# Altium footprint library HamedLib.PcbLib: 221 footprints (part 9 of 14)
Each footprint in its own frame and in the unit in brackets; x right, y up, seen from the top. Pads: shape width x height; smd on the part's side, far side on the other; paste and mask are expansions set on the pad; w line width, h text height; cw(c..) or ccw(c..) is an arc to the next point about the centre after c.
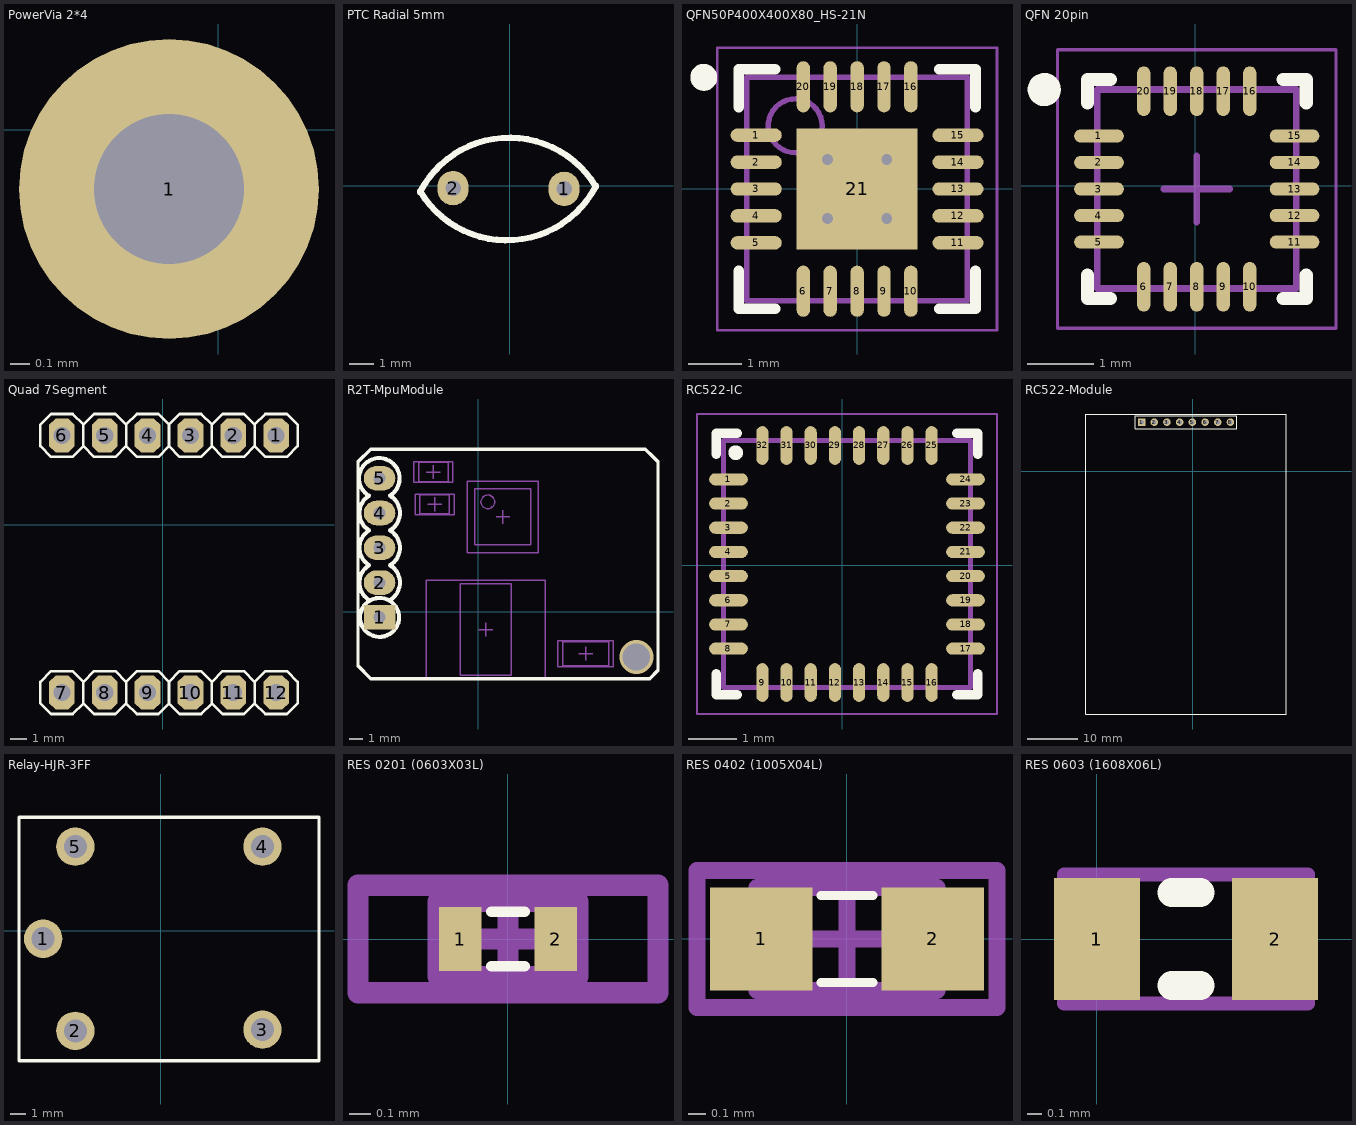
[diagram p8: the footprints below, top view; thin cyan lines are the x and y axes]

## PowerVia2*6 [mm]
via 8.85,-0.725 diameter 1.27 hole 0.711
via 8.85,1.175 diameter 1.27 hole 0.711
via 6.95,1.175 diameter 1.27 hole 0.711
via 6.95,-0.725 diameter 1.27 hole 0.711
via 5.05,-0.725 diameter 1.27 hole 0.711
via 5.05,1.175 diameter 1.27 hole 0.711
via 3.15,1.175 diameter 1.27 hole 0.711
via 3.15,-0.725 diameter 1.27 hole 0.711
via 1.25,-0.725 diameter 1.27 hole 0.711
via 1.25,1.175 diameter 1.27 hole 0.711
via -0.65,1.175 diameter 1.27 hole 0.711
via -0.65,-0.725 diameter 1.27 hole 0.711

## PowerVia 2*2 [mm]
via -1.85,-1.9 diameter 1.27 hole 0.711
via -1.85,0 diameter 1.27 hole 0.711
via 0.05,0 diameter 1.27 hole 0.711
via 0.05,-1.9 diameter 1.27 hole 0.711

## PowerVia 2*3 [mm]
via -2.275,-1.9 diameter 1.27 hole 0.711
via -2.275,0 diameter 1.27 hole 0.711
via -0.375,0 diameter 1.27 hole 0.711
via -0.375,-1.9 diameter 1.27 hole 0.711
via 1.525,-1.9 diameter 1.27 hole 0.711
via 1.525,0 diameter 1.27 hole 0.711

## PowerVia 2*4 [mil]
pads (1):
  round 60 hole 30: 1(-9.84,-11.81)
via -159.45,-11.81 diameter 50 hole 28
via -159.45,62.99 diameter 50 hole 28
via -84.65,62.99 diameter 50 hole 28
via -84.65,-11.81 diameter 50 hole 28
via -9.84,-11.81 diameter 50 hole 28
via 64.96,62.99 diameter 50 hole 28
via 64.96,-11.81 diameter 50 hole 28
via -9.84,62.99 diameter 50 hole 28

## PowerVia 9pin [mm]
via 0.025,1.975 diameter 1.27 hole 0.711
via 0.025,3.875 diameter 1.27 hole 0.711
via 1.925,3.875 diameter 1.27 hole 0.711
via 1.925,1.975 diameter 1.27 hole 0.711
via 3.825,1.975 diameter 1.27 hole 0.711
via 3.825,3.875 diameter 1.27 hole 0.711
via 0.025,0.075 diameter 1.27 hole 0.711
via 1.925,0.075 diameter 1.27 hole 0.711
via 3.825,0.075 diameter 1.27 hole 0.711

## PTC Radial 5mm [mm]
pads (2):
  oval 1.27x1.397 hole 0.635: 1(2.225,-0.125) 2(-2.3,-0.1)
Top Overlay:
  lines w0.254: -3.649,-0.264 cw(c-0.003,-2.141) 3.525,-0.05 ; -3.649,-0.214 ccw(c-0.121,1.877) 3.525,0
3D body "User Library-RXE020-PTC.STEP": height 12.79, standoff -1.9, extent -3.625,-1.65 3.775,1.35

## QFN50P400X400X80_HS-21N [mm] "QFN, 20-Leads, Body 4.00x4.00mm, Pitch 0.50mm, Thermal Pad 2.25x2.25mm, IPC Medium Density"
height 0.8
pads (21):
  oval 0.95x0.25 smd: 1(-1.875,1) 2(-1.875,0.5) 3(-1.875,0) 4(-1.875,-0.5) 5(-1.875,-1) 11(1.875,-1) 12(1.875,-0.5) 13(1.875,0) 14(1.875,0.5) 15(1.875,1)
  oval 0.25x0.95 smd: 6(-1,-1.9) 7(-0.5,-1.9) 8(0,-1.9) 9(0.5,-1.9) 10(1,-1.9) 16(1,1.9) 17(0.5,1.9) 18(0,1.9) 19(-0.5,1.9) 20(-1,1.9)
  rect 2.25x2.25 smd: 21(0,0)
via 0.55,-0.55 diameter 0.5 hole 0.2
via -0.55,-0.55 diameter 0.5 hole 0.2
via 0.55,0.55 diameter 0.5 hole 0.2
via -0.55,0.55 diameter 0.5 hole 0.2
Top Overlay:
  circle w0.25: c-2.85,2.075 r0.125
  lines w0.2: -2.2,-1.525 -2.2,-2.225 -1.525,-2.225 ; -2.2,1.525 -2.2,2.225 -1.525,2.225 ; 1.525,-2.225 2.2,-2.225 2.2,-1.525 ; 1.525,2.225 2.2,2.225 2.2,1.525
Mechanical 13:
  circle w0.1: c-1.15,1.175 r0.5
  lines w0.1: -2.05,-2.075 2.05,-2.075 2.05,2.075 -2.05,2.075 -2.05,-2.075
Mechanical 15:
  lines w0.05: -2.6,-2.625 2.6,-2.625 2.6,2.625 -2.6,2.625 -2.6,-2.625
  lines w0.1: -0.5,0 0.5,0 ; 0,-0.5 0,0.5
3D body "User Library-QFN4x4_20pins.step": height 0.8, standoff 0, extent -2.02,-2.02 2.02,2.02

## QFN 20pin [mm] "MPR121"
pads (20):
  oval 0.75x0.2 smd: 1(-1.45,0.749) 2(-1.45,0.349) 3(-1.45,-0.051) 4(-1.45,-0.451) 5(-1.45,-0.851) 11(1.5,-0.851) 12(1.5,-0.451) 13(1.5,-0.051) 14(1.5,0.349) 15(1.5,0.749)
  oval 0.2x0.75 smd: 6(-0.775,-1.526) 7(-0.375,-1.526) 8(0.025,-1.526) 9(0.425,-1.526) 10(0.825,-1.526) 16(0.825,1.424) 17(0.425,1.424) 18(0.025,1.424) 19(-0.375,1.424) 20(-0.775,1.424)
Top Overlay:
  circle w0.25: c-2.275,1.449 r0.125
  lines w0.2: -1.625,-1.351 -1.625,-1.701 -1.275,-1.701 ; -1.625,1.249 -1.625,1.599 -1.275,1.599 ; 1.325,-1.701 1.675,-1.701 1.675,-1.351 ; 1.325,1.599 1.675,1.599 1.675,1.249
Mechanical 13:
  lines w0.1: -1.475,-1.551 1.525,-1.551 1.525,1.449 -1.475,1.449 -1.475,-1.551
Mechanical 15:
  lines w0.05: -2.075,-2.151 2.125,-2.151 2.125,2.049 -2.075,2.049 -2.075,-2.151
  lines w0.1: -0.475,-0.051 0.525,-0.051 ; 0.025,-0.551 0.025,0.449
3D body "User Library-QFN-20-2.STEP": height 0.75, standoff 0, extent -1.484,-1.561 1.536,1.459

## Quad 7Segment [mil]
height 748.03
pads (12):
  oct 60x80 hole 40: 1(265,208) 2(165,208) 3(65,208) 4(-35,208) 5(-135,208) 6(-235,208) 7(-235,-392) 8(-135,-392) 9(-35,-392) 10(65,-392) 11(165,-392) 12(265,-392)
Top Overlay:
  region: -125,-382 -145,-382 -145,-402 -125,-402
  region: -25,-382 -45,-382 -45,-402 -25,-402
  region: 75,-382 55,-382 55,-402 75,-402
  region: 175,-382 155,-382 155,-402 175,-402
  region: 275,-382 255,-382 255,-402 275,-402
  region: -225,-382 -245,-382 -245,-402 -225,-402
  region: -225,218 -245,218 -245,198 -225,198
  region: 275,218 255,218 255,198 275,198
  region: 175,218 155,218 155,198 175,198
  region: 75,218 55,218 55,198 75,198
  region: -25,218 -45,218 -45,198 -25,198
  region: -125,218 -145,218 -145,198 -125,198
  lines w6: -185,-417 -160,-442 -110,-442 -85,-417 ; -185,-417 -185,-367 ; -185,-417 -210,-442 -260,-442 -285,-417 -285,-367 -260,-342 -210,-342 -185,-367 ; -185,-367 -160,-342 -110,-342 -85,-367 ; -185,183 -210,158 -260,158 -285,183 -285,233 -260,258 -210,258 -185,233 ; -185,183 -185,233 ; -185,183 -160,158 -110,158 -85,183 ; -185,233 -160,258 -110,258 -85,233 ; -85,-417 -60,-442 -10,-442 15,-417 ; -85,-417 -85,-367 ; -85,-367 -60,-342 -10,-342 15,-367 ; -85,183 -85,233 ; -85,183 -60,158 -10,158 15,183 ; -85,233 -60,258 -10,258 15,233 ; 15,-417 40,-442 90,-442 115,-417 ; 15,-417 15,-367 ; 15,-367 40,-342 90,-342 115,-367 ; 15,183 15,233 ; 15,183 40,158 90,158 115,183 ; 15,233 40,258 90,258 115,233 ; 115,-417 140,-442 190,-442 215,-417 ; 115,-417 115,-367 ; 115,-367 140,-342 190,-342 215,-367 ; 115,183 115,233 ; 115,183 140,158 190,158 215,183 ; 115,233 140,258 190,258 215,233 ; 215,-417 240,-442 290,-442 315,-417 315,-367 290,-342 240,-342 215,-367 ; 215,-417 215,-367 ; 215,183 215,233 ; 215,183 240,158 290,158 315,183 315,233 290,258 240,258 215,233
3D body "quad 7segment.STEP": height 476.38, standoff 196.85, extent -978.88,-466.03 1029,282

## R2T-MpuModule [mm]
pads (5):
  rect 2.3x1.8 hole 0.9: 1(-7.2,-0.399)
  oval 2.3x1.8 hole 0.9: 2(-7.2,2.141) 3(-7.2,4.681) 4(-7.2,7.221) 5(-7.2,9.761)
via 11.55,-3.289 diameter 2.5 hole 2
Bottom Layer:
  lines w0.25: -7.2,9.761 -7.2,10.286
Top Overlay:
  circle w0.3: c-7.2,-0.399 r1.42
  lines w0.25: -7.877,-4.839 -8.775,-3.941 -8.775,10.961 -7.85,11.886 12.2,11.886 12.775,11.311 13.125,10.961 13.125,-4.264 12.525,-4.864 -7.852,-4.864
  lines w0.3: -7.985,8.477 cw(c-7.223,9.747) -6.438,8.491 cw(c-7.2,7.221) -6.438,5.951 cw(c-7.2,4.681) -6.438,3.411 cw(c-7.2,2.141) -6.438,0.871 ; -7.962,0.871 cw(c-7.2,2.141) -7.962,3.411 cw(c-7.2,4.681) -7.962,5.951 cw(c-7.2,7.221) -7.962,8.491
Mechanical 13:
  circle w0.1: c0.7,8.036 r0.5
  lines w0.1: -4.35,9.511 -4.35,10.911 -2.2,10.911 -2.2,9.511 -4.35,9.511 ; -4.25,7.156 -4.25,8.556 -2.1,8.556 -2.1,7.156 -4.25,7.156 ; -1.3,-4.639 2.4,-4.639 2.4,2.061 -1.3,2.061 -1.3,-4.639 ; -0.25,4.886 3.85,4.886 3.85,8.986 -0.25,8.986 -0.25,4.886 ; 6.173,-3.914 6.173,-2.164 9.523,-2.164 9.523,-3.914 6.173,-3.914
Mechanical 15:
  lines w0.1: -3.775,10.211 -2.775,10.211 ; -3.675,7.856 -2.675,7.856 ; -3.275,9.711 -3.275,10.711 ; -3.175,7.356 -3.175,8.356 ; 0.05,-1.289 1.05,-1.289 ; 0.55,-1.789 0.55,-0.789 ; 1.3,6.936 2.3,6.936 ; 1.8,6.436 1.8,7.436 ; 7.348,-3.039 8.348,-3.039 ; 7.848,-3.539 7.848,-2.539 ; -4.7,9.461 -4.7,10.961 -1.85,10.961 -1.85,9.461 -4.7,9.461 ; -4.6,7.106 -4.6,8.606 -1.75,8.606 -1.75,7.106 -4.6,7.106 ; -3.8,-4.889 4.9,-4.889 4.9,2.311 -3.8,2.311 -3.8,-4.889 ; -0.8,4.336 4.4,4.336 4.4,9.536 -0.8,9.536 -0.8,4.336 ; 5.823,-3.989 5.823,-2.089 9.873,-2.089 9.873,-3.989 5.823,-3.989
3D body: height 7, standoff 0, extent -7.622,-0.774 -6.825,0.024
3D body: height 7, standoff 0, extent -7.622,1.776 -6.825,2.574
3D body: height 7, standoff 0, extent -7.622,4.326 -6.825,5.124
3D body: height 7, standoff 0, extent -7.622,6.851 -6.825,7.649
3D body: height 7, standoff 0, extent -7.622,9.426 -6.825,10.224
3D body "Mpu6055_PCB.step": height 7.36, standoff 3.81, extent -9.05,-5.1 13.25,12.1

## RC522-IC [mm]
pads (32):
  oval 0.8x0.25 smd: 1(-2.354,1.775) 2(-2.354,1.275) 3(-2.354,0.775) 4(-2.354,0.275) 5(-2.354,-0.225) 6(-2.354,-0.725) 7(-2.354,-1.225) 8(-2.354,-1.725) 17(2.546,-1.725) 18(2.546,-1.225) 19(2.546,-0.725) 20(2.546,-0.225) 21(2.546,0.275) 22(2.546,0.775) 23(2.546,1.275) 24(2.546,1.775)
  oval 0.25x0.8 smd: 9(-1.654,-2.425) 10(-1.154,-2.425) 11(-0.654,-2.425) 12(-0.154,-2.425) 13(0.346,-2.425) 14(0.846,-2.425) 15(1.346,-2.425) 16(1.846,-2.425) 25(1.846,2.475) 26(1.346,2.475) 27(0.846,2.475) 28(0.346,2.475) 29(-0.154,2.475) 30(-0.654,2.475) 31(-1.154,2.475) 32(-1.654,2.475)
Top Overlay:
  circle w0.254: c-2.204,2.325 r0.025
  lines w0.2: -2.604,-2.25 -2.604,-2.675 -2.179,-2.675 ; -2.604,2.3 -2.604,2.725 -2.179,2.725 ; 2.371,-2.675 2.796,-2.675 2.796,-2.25 ; 2.371,2.725 2.796,2.725 2.796,2.3
Mechanical 13:
  lines w0.1: -2.454,-2.525 2.646,-2.525 2.646,2.575 -2.454,2.575 -2.454,-2.525
Mechanical 15:
  lines w0.05: -3.004,-3.075 3.196,-3.075 3.196,3.125 -3.004,3.125 -3.004,-3.075
3D body "User Library-QFN-32UH.step": height 0.75, standoff 0, extent -2.408,-2.484 2.612,2.536

## RC522-Module [mm]
pads (8):
  rect 1.5x1.5 hole 0.9: 1(-10.24,9.785)
  round 1.5 hole 0.9: 2(-7.7,9.785) 3(-5.16,9.785) 4(-2.62,9.785) 5(-0.08,9.785) 6(2.46,9.785) 7(5,9.785) 8(7.54,9.785)
Top Overlay:
  lines w0.2: -21.35,-48.575 -21.35,11.425 18.65,11.425 18.65,-48.575 -21.35,-48.575 ; -11.51,8.515 -11.51,11.055 8.81,11.055 8.81,8.515 -11.51,8.515
Mechanical 1:
  lines w0.2: -21.35,-48.575 -20.35,-48.575
3D body "rc522.STEP": height 8.5, standoff -6.3, extent -20.85,-49.025 19.15,10.975

## Relay-HJR-3FF [mm]
pads (5):
  round 2.5 hole 1.5: 1(-7.653,-0.537) 2(-5.553,-6.537) 3(6.647,-6.459) 4(6.647,5.463) 5(-5.553,5.463)
Top Overlay:
  lines w0.2: -9.226,-8.491 -9.226,7.384 10.332,7.384 10.332,-8.491 -9.226,-8.491
3D body "User Library-RELE.step": height 15, standoff -3, extent -9.197,-8.567 10.303,7.333

## RES 0201 (0603X03L) [mm] "Chip Resistor, 2-Leads, Body 0.6x0.3mm, IPC High Density (0.05 W)"
height 0.3
pads (2):
  rect 0.2x0.3 smd: 1(-0.223,0) 2(0.223,0)
Top Overlay:
  lines w0.051: -0.076,-0.127 0.076,-0.127 ; -0.076,0.127 0.076,0.127
Mechanical 13:
  lines w0.1: -0.325,-0.175 0.325,-0.175 0.325,0.175 -0.325,0.175 -0.325,-0.175
Mechanical 15:
  lines w0.1: -0.175,0 0.175,0 ; 0,-0.175 0,0.175 ; -0.7,-0.25 0.7,-0.25 0.7,0.25 -0.7,0.25 -0.7,-0.25
3D body "0201.STEP": height 0.25, standoff 0, extent -0.254,-0.127 0.254,0.127

## RES 0402 (1005X04L) [mm] "Chip Resistor, 2-Leads, Body 1.0x0.5mm, IPC High Density _ (0.031/0.063 W)"
height 0.4
pads (2):
  rect 0.6x0.6 smd: 1(-0.5,0) 2(0.5,0)
Top Overlay:
  lines w0.051: -0.152,-0.254 0.152,-0.254 ; -0.152,0.254 0.152,0.254
Mechanical 13:
  lines w0.1: -0.525,-0.3 0.525,-0.3 0.525,0.3 -0.525,0.3 -0.525,-0.3
Mechanical 15:
  lines w0.1: -0.3,0 0.3,0 ; 0,-0.3 0,0.3 ; -0.875,-0.4 0.875,-0.4 0.875,0.4 -0.875,0.4 -0.875,-0.4
3D body "0402.STEP": height 0.35, standoff 0, extent -0.508,-0.254 0.508,0.254

## RES 0603 (1608X06L) [mm] "Chip Resistor, 2-Leads, Body 1.6x0.8mm, IPC High Density _ (0.063W)"
height 0.6
pads (2):
  rect 0.6x0.85 smd: 1(0,0) 2(1.244,0)
Top Overlay:
  lines w0.2: 0.522,-0.325 0.722,-0.325 ; 0.522,0.325 0.722,0.325
Mechanical 13:
  lines w0.1: -0.228,-0.45 1.472,-0.45 1.472,0.45 -0.228,0.45 -0.228,-0.45
3D body "0603.STEP": height 0.45, standoff 0, extent -0.14,-0.381 1.384,0.381